# Altium footprint library Film-cap.PcbLib: 33 footprints (part 1 of 3)
Each footprint in its own frame and in the unit in brackets; x right, y up, seen from the top. Pads: shape width x height; smd on the part's side, far side on the other; paste and mask are expansions set on the pad; w line width, h text height; cw(c..) or ccw(c..) is an arc to the next point about the centre after c.
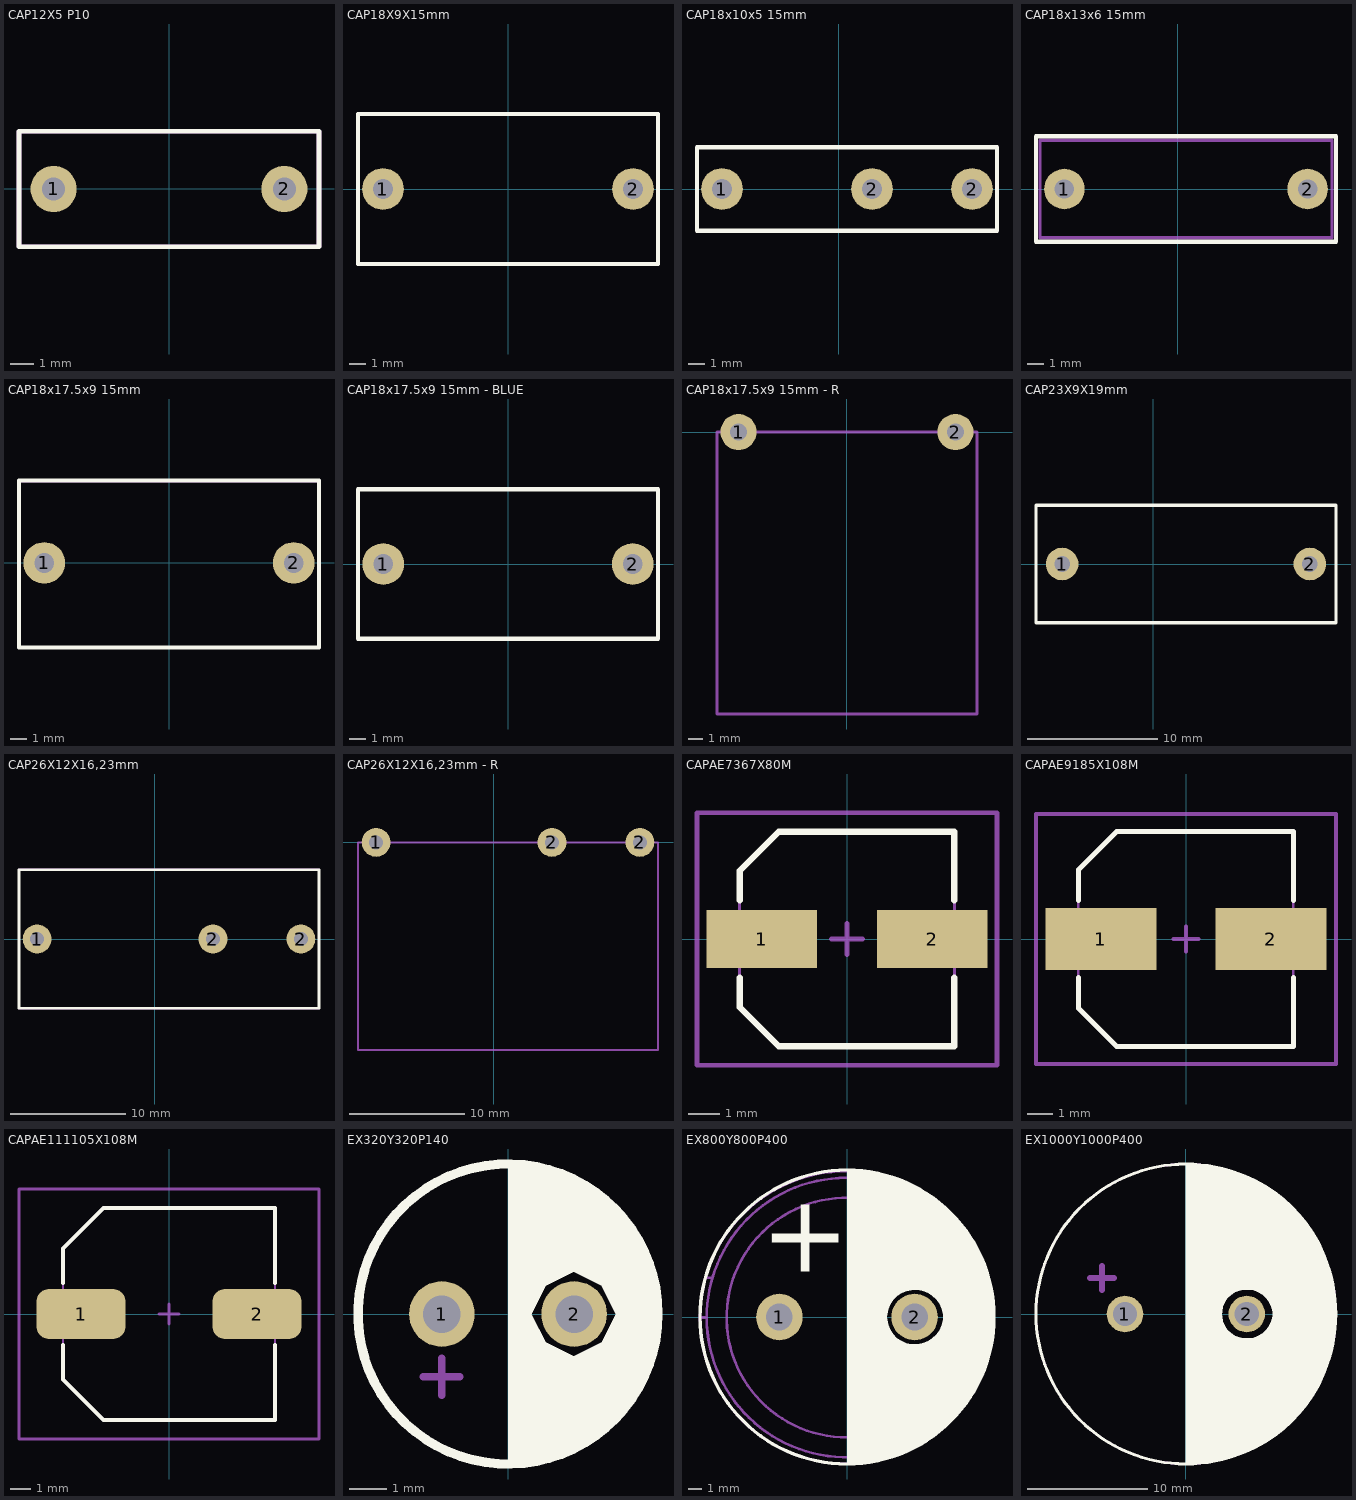
[diagram p0: the footprints below, top view; thin cyan lines are the x and y axes]

## CAP12X5 P10 [mm]
height 10
pads (2):
  round 2 hole 1: 1(-5,0) 2(5,0)
Top Overlay:
  lines w0.2: -6.5,-2.5 6.5,-2.5 6.5,2.5 -6.5,2.5 -6.5,-2.5
Top Assembly:
  lines w0.2: -6.5,-2.5 ccw(c-6.5,-2.5) -6.5,-2.5 ; -6.5,-2.5 -6.5,2.5 ; -6.5,-2.5 6.5,-2.5 ; -6.5,2.5 ccw(c-6.5,2.5) -6.5,2.5 ; -6.5,2.5 6.5,2.5 ; 6.5,-2.5 ccw(c6.5,-2.5) 6.5,-2.5 ; 6.5,-2.5 6.5,2.5 ; 6.5,2.5 ccw(c6.5,2.5) 6.5,2.5
3D body: height 10, standoff 0.2, extent -6.5,-2.5 6.5,2.5

## CAP18X9X15mm [mm]
pads (2):
  round 2.5 hole 1.2: 1(-7.5,0) 2(7.5,0)
Top Overlay:
  lines w0.254: -9,-4.5 9,-4.5 9,4.5 -9,4.5 -9,-4.5
Top Assembly:
  lines w0.178: -9,-4.5 9,-4.5 9,4.5 -9,4.5 -9,-4.5
3D body "User Library-CBB81_W18_5_H14_0_T9_0_P15_0.STEP": height 20, standoff -7, extent -9.249,-4.5 9.249,4.5

## CAP18x10x5 15mm [mm]
pads (3):
  round 2.5 hole 1.2: 1(-7,0) 2(2,0) 2(8,0)
Top Overlay:
  lines w0.254: -8.5,-2.5 -8.5,2.5 9.5,2.5 9.5,-2.5 -8.5,-2.5
Top Assembly:
  lines w0.2: -8.5,-2.5 9.5,-2.5 9.5,2.5 -8.5,2.5 -8.5,-2.5
3D body: height 10, standoff 0, extent -8.5,-2.5 9.5,2.5

## CAP18x13x6 15mm [mm]
pads (2):
  round 2.5 hole 1.2: 1(-7,0) 2(8,0)
Top Overlay:
  lines w0.254: -8.75,-3.25 9.75,-3.25 9.75,3.25 -8.75,3.25 -8.75,-3.25
Top Assembly:
  lines w0.2: -8.5,-3 -8.5,3 9.5,3 9.5,-3 -8.5,-3
3D body: height 13, standoff 0, extent -8.5,-3 9.5,3

## CAP18x17.5x9 15mm [mm]
pads (2):
  round 2.5 hole 1.2: 1(-7.5,0) 2(7.5,0)
Top Overlay:
  lines w0.254: -9.017,-5.08 9.017,-5.08 9.017,4.953 -9.017,4.953 -9.017,-5.08
Top Assembly:
  lines w0.2: -9,-5.08 9,-5.08 9,4.921 -9,4.921 -9,-5.08
3D body "User Library-Hua Jung MKP-824K0305AB1151-P.step": height 19.5, standoff -1.81, extent -9,-5.08 9,4.921

## CAP18x17.5x9 15mm - BLUE [mm]
pads (2):
  round 2.5 hole 1.2: 1(-7.5,0) 2(7.5,0)
Top Overlay:
  lines w0.254: -9.017,-4.5 9.017,-4.5 9.017,4.5 -9.017,4.5 -9.017,-4.5
Top Assembly:
  lines w0.2: -9,-4.5 9,-4.5 9,4.5 -9,4.5 -9,-4.5
3D body "User Library-CAP X2-9X17_5X18.STEP": height 17.5, standoff -2, extent -9,-4.5 9,4.5

## CAP18x17.5x9 15mm - R [mm]
pads (2):
  round 2.5 hole 1.2: 1(-7.5,0) 2(7.5,0)
Top Assembly:
  lines w0.2: -9,-19.5 -9,0 9,0 9,-19.5 -9,-19.5
3D body "User Library-CAP X2-9X17_5X18.STEP": height 14, standoff 5, extent -9,-19.5 9,0

## CAP23X9X19mm [mm]
pads (2):
  round 2.5 hole 1.2: 1(-7,0) 2(12,0)
Top Overlay:
  lines w0.254: -9,-4.5 14,-4.5 14,4.5 -9,4.5 -9,-4.5
Top Assembly:
  lines w0.178: -9,-4.5 14,-4.5 14,4.5 -9,4.5 -9,-4.5
3D body "User Library-CBB81_W23_0_H16_0_T9_0_P19_0.STEP": height 19, standoff -10, extent -8.998,-4.5 14,4.5

## CAP26X12X16,23mm [mm]
pads (3):
  round 2.5 hole 1.2: 1(-10.215,0) 2(5.025,0) 2(12.645,0)
Top Overlay:
  lines w0.254: -11.785,-6 14.215,-6 14.215,6 -11.785,6 -11.785,-6
Top Assembly:
  lines w0.178: -11.785,-6 14.215,-6 14.215,6 -11.785,6 -11.785,-6
3D body: height 18.1, standoff 0, extent -11.785,-6 14.25,6

## CAP26X12X16,23mm - R [mm]
pads (3):
  round 2.5 hole 1.2: 1(-10.215,0) 2(5.025,0) 2(12.645,0)
Top Assembly:
  lines w0.178: -11.785,-18 14.215,-18 14.215,0 -11.785,0 -11.785,-18
3D body: height 16, standoff 4, extent -11.785,-18.1 14.25,0

## CAPAE7367X80M [mm] "Aluminum Electrolytic Capacitor, Body 6,70x6,70x8,00mm, IPC Low Density"
height 8
pads (2):
  rect 3.5x1.85 smd: 1(-2.7,0) 2(2.7,0)
Top Overlay:
  lines w0.2: -3.4,-1.225 -3.4,-2.163 -2.163,-3.4 3.4,-3.4 3.4,-1.225 ; -3.4,1.225 -3.4,2.163 -2.163,3.4 3.4,3.4 3.4,1.225
Top Assembly:
  lines w0.1: -3.4,-2.163 -2.163,-3.4 3.4,-3.4 3.4,3.4 -2.163,3.4 -3.4,2.163 -3.4,-2.163
Top Component Outline:
  lines w0.15: -0.5,0 0.5,0 ; 0,-0.5 0,0.5 ; -4.75,-4 -4.75,4 4.75,4 4.75,-4 -4.75,-4
3D body "CAPAE7367X80M.step": height 8, standoff 0, extent -3.65,-3.4 3.65,3.4

## CAPAE9185X108M [mm] "Aluminum Electrolytic Capacitor, Body 8,50x8,50x10,80mm, IPC Low Density"
height 10.8
pads (2):
  rect 4.45x2.5 smd: 1(-3.4,0) 2(3.4,0)
Top Overlay:
  lines w0.2: -4.3,-1.55 -4.3,-2.775 -2.775,-4.3 4.3,-4.3 4.3,-1.55 ; -4.3,1.55 -4.3,2.775 -2.775,4.3 4.3,4.3 4.3,1.55
Top Assembly:
  lines w0.1: -4.3,-2.775 -2.775,-4.3 4.3,-4.3 4.3,4.3 -2.775,4.3 -4.3,2.775 -4.3,-2.775
Top Component Outline:
  lines w0.15: -0.5,0 0.5,0 ; 0,-0.5 0,0.5 ; -6,-5 -6,5 6,5 6,-5 -6,-5
3D body "CAPAE9185X108M.step": height 10.8, standoff 0, extent -4.55,-4.3 4.55,4.3

## CAPAE111105X108M [mm] "Aluminum Electrolytic Capacitor, Body 10,50x10,50x10,80mm, IPC Low Density"
height 10.8
pads (2):
  rrect50% 4.45x2.5 smd: 1(-4.4,0) 2(4.4,0)
Top Overlay:
  lines w0.2: -5.3,-1.55 -5.3,-3.275 -3.275,-5.3 5.3,-5.3 5.3,-1.55 ; -5.3,1.55 -5.3,3.275 -3.275,5.3 5.3,5.3 5.3,1.55
Top Assembly:
  lines w0.1: -5.3,-3.275 -5.3,3.275 -3.275,5.3 5.3,5.3 5.3,-5.3 -3.275,-5.3 -5.3,-3.275
Top Component Outline:
  lines w0.15: -0.5,0 0.5,0 ; 0,-0.5 0,0.5 ; -7.5,-6.25 7.5,-6.25 7.5,6.25 -7.5,6.25 -7.5,-6.25
3D body "CAPAE111105X108M.step": height 10.8, standoff 0, extent -5.55,-5.3 5.55,5.3

## EX320Y320P140 [mil]
pads (2):
  round 70 hole 40: 1(-70.47,0) 2(70.47,0)
Top Overlay:
  circle w10: c0,0 r160
  region: 25,0 40,30 70,45 100,30 115,0 160,0 150,60 115,115 70,145 0,160 0,0
  region: 0,0 0,-160 70,-145 115,-115 150,-60 160,0 115,0 100,-30 70,-45 40,-30 25,0
Top Assembly:
  circle w10: c-70.47,0 r10
  circle w10: c70.47,0 r10
  circle w7.01: c0,0 r160
  lines w7.87: -90.55,-66.93 -51.18,-66.93 ; -70.87,-86.61 -70.87,-47.24
3D body "User Library-Cap-EL(8x12-3_5)T.step": height 494.33, standoff -119.92, extent -153.54,-157.41 161.5,157.41

## EX800Y800P400 [mm]
pads (2):
  round 3.5 hole 2 paste-25.4: 1(-5.08,0) 2(5.08,0)
Top Overlay:
  circle w0.254: c0,0 r11.045
  region: 0,0 0,11 0.045,11 0.478,11 1.339,10.932 2.193,10.797 3.034,10.595 3.856,10.328 4.654,9.997 5.424,9.605 6.161,9.153 6.861,8.645 7.518,8.084 8.129,7.473 8.691,6.815 9.199,6.116 9.65,5.379 10.043,4.609 10.373,3.81 10.641,2.988 10.842,2.148 10.978,1.294 11.045,0.432 11.045,0 7.25,0 7.231,0.208 7.134,0.613 6.959,0.992 6.714,1.329 6.407,1.612 6.052,1.829 5.661,1.973 5.249,2.038 5.04,2.04 4.84,2.03 4.448,1.952 4.078,1.799 3.746,1.577 3.463,1.294 3.241,0.962 3.088,0.592 3.01,0.2 3,0
  region: 0,0 0,-11 0.045,-11 0.478,-11 1.339,-10.932 2.193,-10.797 3.034,-10.595 3.856,-10.328 4.654,-9.997 5.424,-9.605 6.161,-9.153 6.861,-8.645 7.518,-8.084 8.129,-7.473 8.691,-6.815 9.199,-6.116 9.65,-5.379 10.043,-4.609 10.373,-3.81 10.641,-2.988 10.842,-2.148 10.978,-1.294 11.045,-0.432 11.045,0 7.25,0 7.231,-0.208 7.134,-0.613 6.959,-0.992 6.714,-1.329 6.407,-1.612 6.052,-1.829 5.661,-1.973 5.249,-2.038 5.04,-2.04 4.84,-2.03 4.448,-1.952 4.078,-1.799 3.746,-1.577 3.463,-1.294 3.241,-0.962 3.088,-0.592 3.01,-0.2 3,0
  text "+" at -6.5,1.5 h10
Top Assembly:
  lines w0.2: -11.046,-0.037 cw(c-0.046,-0.037) -10.629,2.963 ; -11.046,-0.037 ccw(c-0.046,-0.037) 10.954,-0.037 ; -11.046,-0.037 -10.546,-0.037 ; -10.629,2.963 cw(c-0.046,-0.037) 10.537,2.963 ; -10.629,2.963 -10.109,2.963 ; -10.546,-0.037 ccw(c-0.046,-0.037) 10.454,-0.037 ; -10.546,-0.037 cw(c-0.046,-0.037) -10.109,2.963 ; -10.109,2.963 cw(c-0.046,-0.037) 10.016,2.963 ; 8.458,2.908 ccw(c-0.046,-0.037) 8.954,-0.037 ; 8.458,2.908 cw(c-0.046,-0.037) 8.954,-0.037 ; 8.458,2.908 10.016,2.963 ; 8.954,-0.037 10.454,-0.037 ; 10.016,2.963 cw(c-0.046,-0.037) 10.454,-0.037 ; 10.016,2.963 10.537,2.963 ; 10.454,-0.037 10.954,-0.037 ; 10.537,2.963 cw(c-0.046,-0.037) 10.954,-0.037
  text "+" at -6.5,1.7 h10
3D body "User Library-ECEC2DP271BJ.SLDPRT": height 25, standoff 0, extent -11,-11 11,11

## EX1000Y1000P400 [mil]
pads (2):
  round 120 hole 80: 1(-200,0) 2(200,0)
Top Overlay:
  circle w10: c0,0 r492.13
  region: 0,0 0,433.07 0,492.12 29.53,492.12 48.28,491.54 85.59,487.44 122.45,480.43 158.66,470.54 193.97,457.85 228.19,442.42 261.08,424.36 292.46,403.77 322.12,380.78 349.89,355.54 375.6,328.2 399.08,298.92 420.19,267.89 438.8,235.3 454.79,201.35 468.07,166.25 478.56,130.22 486.19,93.47 490.91,56.24 492.7,18.76 492.12,0 285.43,0 284.7,8.18 280.86,24.14 273.98,39.04 264.32,52.32 252.26,63.45 238.26,72.01 222.85,77.68 206.64,80.24 198.43,80.31 190.55,79.93 175.11,76.86 160.56,70.83 147.47,62.08 136.34,50.95 127.59,37.86 121.57,23.31 118.5,7.87 118.11,0
  region: 0,0 0,-433.07 0,-492.12 29.53,-492.12 48.28,-491.54 85.59,-487.44 122.45,-480.43 158.66,-470.54 193.97,-457.85 228.19,-442.42 261.08,-424.36 292.46,-403.77 322.12,-380.78 349.89,-355.54 375.6,-328.2 399.08,-298.92 420.19,-267.89 438.8,-235.3 454.79,-201.35 468.07,-166.25 478.56,-130.22 486.19,-93.47 490.91,-56.24 492.7,-18.76 492.12,0 285.43,0 284.7,-8.18 280.86,-24.14 273.98,-39.04 264.32,-52.32 252.26,-63.45 238.26,-72.01 222.85,-77.68 206.64,-80.24 198.43,-80.31 190.55,-79.93 175.11,-76.86 160.56,-70.83 147.47,-62.08 136.34,-50.95 127.59,-37.86 121.57,-23.31 118.5,-7.87 118.11,0
Top Assembly:
  circle w10: c-200,0 r15
  circle w10: c200,0 r15
  circle w7.01: c0,0 r492.13
  lines w19.68: -314.96,118.11 -236.22,118.11 ; -275.59,78.74 -275.59,157.48
3D body "User Library-CE_R530_D1000_H1750.step": height 1661.42, standoff -98.43, extent -495,-500 505,500